# Altium footprint library ref-packages.PCBLIB: 1544 footprints (part 27 of 103)
Each footprint in its own frame and in the unit in brackets; x right, y up, seen from the top. Pads: shape width x height; smd on the part's side, far side on the other; paste and mask are expansions set on the pad; w line width, h text height; cw(c..) or ccw(c..) is an arc to the next point about the centre after c.
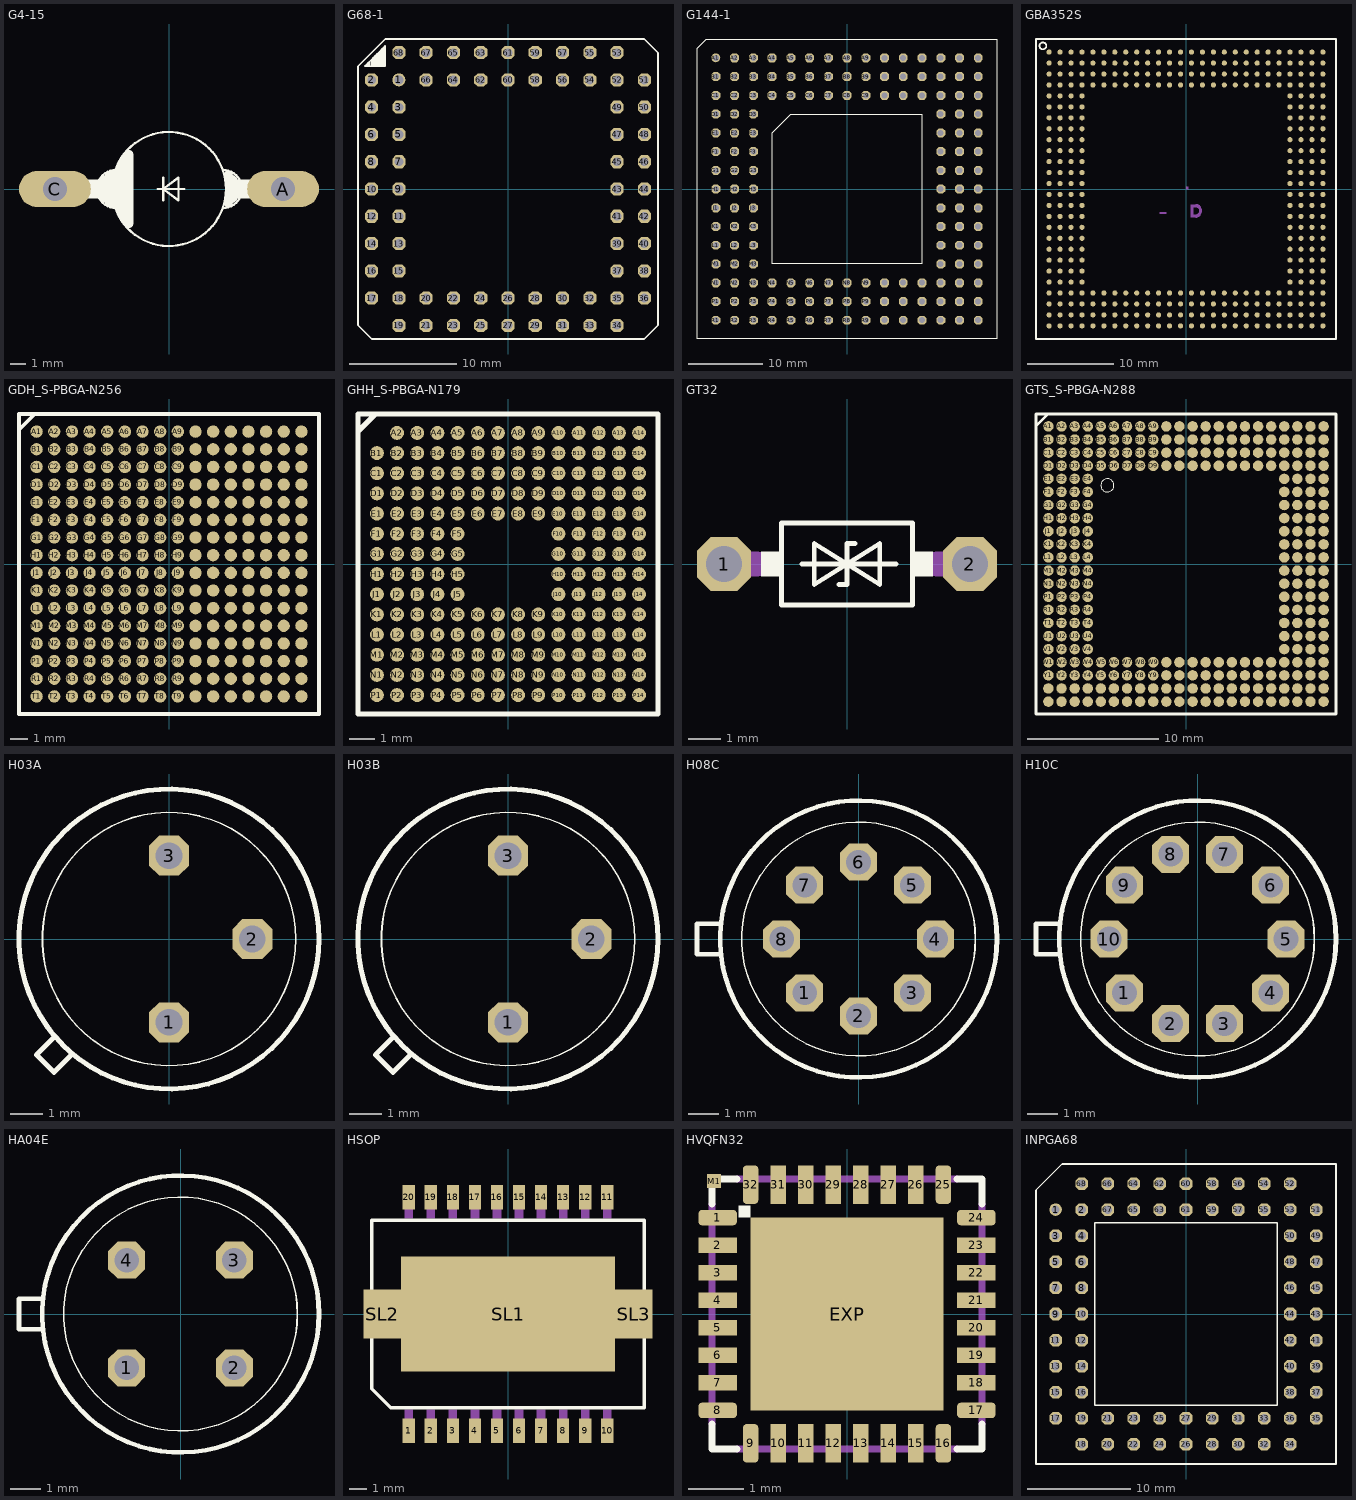
[diagram p26: the footprints below, top view; thin cyan lines are the x and y axes]

## G4-15 [mil]
pads (2):
  oval 189x94.5 hole 63: A(300,0) C(-300,0)
Top Overlay:
  circle w6: c0,0 r150
  rectangle: 150,-25 230,25
  rectangle: -230,-25 -150,25
  lines w6: -140,-50 cw(c-140,0) -140,50 ; -30,0 -15,0 ; -15,-30 -15,0 ; -15,30 -15,0 ; 40,0 -15,0 ; 141.97,-50 ccw(c141.97,0) 141.97,50 ; -15,0 25,-30 25,30 -15,0
  lines w24: -170,-20 -155,-35 ; -170,20 -155,35 ; -140,-40 -140,40 ; -115,-80 -125,-60 -125,60 -115,80 ; -105,-90 -105,90 ; 155,-35 170,-20 ; 155,35 170,20
Mechanical 16:
  lines w50: -300,0 -225,0 ; 225,0 300,0

## G68-1 [mil]
pads (68):
  round 48 hole 32: 1(-400,400)
  oct 48x48 hole 32: 2(-500,400) 3(-400,300) 4(-500,300) 5(-400,200) 6(-500,200) 7(-400,100) 8(-500,100) 9(-400,0) 10(-500,0) 11(-400,-100) 12(-500,-100) 13(-400,-200) 14(-500,-200) 15(-400,-300) 16(-500,-300) 17(-500,-400) 18(-400,-400) 19(-400,-500) 20(-300,-400) 21(-300,-500) 22(-200,-400) 23(-200,-500) 24(-100,-400) 25(-100,-500) 26(0,-400) 27(0,-500) 28(100,-400) 29(100,-500) 30(200,-400) 31(200,-500) 32(300,-400) 33(300,-500) 34(400,-500) 35(400,-400) 36(500,-400) 37(400,-300) 38(500,-300) 39(400,-200) 40(500,-200) 41(400,-100) 42(500,-100) 43(400,0) 44(500,0) 45(400,100) 46(500,100) 47(400,200) 48(500,200) 49(400,300) 50(500,300) 51(500,400) 52(400,400) 53(400,500) 54(300,400) 55(300,500) 56(200,400) 57(200,500) 58(100,400) 59(100,500) 60(0,400) 61(0,500) 62(-100,400) 63(-100,500) 64(-200,400) 65(-200,500) 66(-300,400) 67(-300,500) 68(-400,500)
Top Overlay:
  lines w6: -518.74,450 -512.5,450 ; -518.74,450 -525,450 -518.74,456.26 ; -518.74,450 -518.74,456.26 ; -518.74,456.26 -512.5,462.5 ; -512.5,450 -506.26,450 ; -512.5,450 -512.5,462.5 ; -512.5,462.5 -506.26,468.74 ; -506.26,450 -500,450 ; -506.26,450 -506.26,468.74 ; -506.26,468.74 -500,475 ; -500,450 -493.74,450 ; -500,450 -500,475 ; -500,475 -493.74,481.26 ; -493.74,450 -487.5,450 ; -493.74,450 -493.74,481.26 ; -493.74,481.26 -487.5,487.5 ; -487.5,450 -481.26,450 ; -487.5,450 -487.5,487.5 ; -487.5,487.5 -481.26,493.74 ; -481.26,450 -475,450 ; -481.26,450 -481.26,493.74 ; -481.26,493.74 -475,500 ; -475,450 -468.74,450 ; -475,450 -475,500 ; -475,500 -468.74,506.26 ; -468.74,450 -462.5,450 ; -468.74,450 -468.74,506.26 ; -468.74,506.26 -462.5,512.5 ; -462.5,450 -456.26,450 ; -462.5,450 -462.5,512.5 ; -462.5,512.5 -456.26,518.74 ; -456.26,450 -450,450 -450,525 -456.26,518.74 ; -456.26,450 -456.26,518.74 ; -550,-500 -500,-550 500,-550 550,-500 550,500 500,550 -450,550 -550,450 -550,-500

## G144-1 [mil]
pads (144):
  round 48 hole 32: A1(-700,700)
  oct 48x48 hole 32: A2(-600,700) A3(-500,700) A4(-400,700) A5(-300,700) A6(-200,700) A7(-100,700) A8(0,700) A9(100,700) A10(200,700) A11(300,700) A12(400,700) A13(500,700) A14(600,700) A15(700,700) B1(-700,600) B2(-600,600) B3(-500,600) B4(-400,600) B5(-300,600) B6(-200,600) B7(-100,600) B8(0,600) B9(100,600) B10(200,600) B11(300,600) B12(400,600) B13(500,600) B14(600,600) B15(700,600) C1(-700,500) C2(-600,500) C3(-500,500) C4(-400,500) C5(-300,500) C6(-200,500) C7(-100,500) C8(0,500) C9(100,500) C10(200,500) C11(300,500) C12(400,500) C13(500,500) C14(600,500) C15(700,500) D1(-700,400) D2(-600,400) D3(-500,400) D13(500,400) D14(600,400) D15(700,400) E1(-700,300) E2(-600,300) E3(-500,300) E13(500,300) E14(600,300) E15(700,300) F1(-700,200) F2(-600,200) F3(-500,200) F13(500,200) F14(600,200) F15(700,200) G1(-700,100) G2(-600,100) G3(-500,100) G13(500,100) G14(600,100) G15(700,100) H1(-700,0) H2(-600,0) H3(-500,0) H13(500,0) H14(600,0) H15(700,0) J1(-700,-100) J2(-600,-100) J3(-500,-100) J13(500,-100) J14(600,-100) J15(700,-100) K1(-700,-200) K2(-600,-200) K3(-500,-200) K13(500,-200) K14(600,-200) K15(700,-200) L1(-700,-300) L2(-600,-300) L3(-500,-300) L13(500,-300) L14(600,-300) L15(700,-300) M1(-700,-400) M2(-600,-400) M3(-500,-400) M13(500,-400) M14(600,-400) M15(700,-400) N1(-700,-500) N2(-600,-500) N3(-500,-500) N4(-400,-500) N5(-300,-500) N6(-200,-500) N7(-100,-500) N8(0,-500) N9(100,-500) N10(200,-500) N11(300,-500) N12(400,-500) N13(500,-500) N14(600,-500) N15(700,-500) P1(-700,-600) P2(-600,-600) P3(-500,-600) P4(-400,-600) P5(-300,-600) P6(-200,-600) P7(-100,-600) P8(0,-600) P9(100,-600) P10(200,-600) P11(300,-600) P12(400,-600) P13(500,-600) P14(600,-600) P15(700,-600) R1(-700,-700) R2(-600,-700) R3(-500,-700) R4(-400,-700) R5(-300,-700) R6(-200,-700) R7(-100,-700) R8(0,-700) R9(100,-700) R10(200,-700) R11(300,-700) R12(400,-700) R13(500,-700) R14(600,-700) R15(700,-700)
Top Overlay:
  lines w6: -800,-800 800,-800 800,800 -750,800 -800,750 -800,-800 ; -400,-400 400,-400 400,400 -300,400 -400,300 -400,-400

## GBA352S [mil]
pads (352):
  rrect100% 23.62x23.62 smd: A1(-625,625) A2(-575,625) A3(-525,625) A4(-475,625) A5(-425,625) A6(-375,625) A7(-325,625) A8(-275,625) A9(-225,625) A10(-175,625) A11(-125,625) A12(-75,625) A13(-25,625) A14(25,625) A15(75,625) A16(125,625) A17(175,625) A18(225,625) A19(275,625) A20(325,625) A21(375,625) A22(425,625) A23(475,625) A24(525,625) A25(575,625) A26(625,625) AA1(-625,-375) AA2(-575,-375) AA3(-525,-375) AA4(-475,-375) AA23(475,-375) AA24(525,-375) AA25(575,-375) AA26(625,-375) AB1(-625,-425) AB2(-575,-425) AB3(-525,-425) AB4(-475,-425) AB23(475,-425) AB24(525,-425) AB25(575,-425) AB26(625,-425) AC1(-625,-475) AC2(-575,-475) AC3(-525,-475) AC4(-475,-475) AC5(-425,-475) AC6(-375,-475) AC7(-325,-475) AC8(-275,-475) AC9(-225,-475) AC10(-175,-475) AC11(-125,-475) AC12(-75,-475) AC13(-25,-475) AC14(25,-475) AC15(75,-475) AC16(125,-475) AC17(175,-475) AC18(225,-475) AC19(275,-475) AC20(325,-475) AC21(375,-475) AC22(425,-475) AC23(475,-475) AC24(525,-475) AC25(575,-475) AC26(625,-475) AD1(-625,-525) AD2(-575,-525) AD3(-525,-525) AD4(-475,-525) AD5(-425,-525) AD6(-375,-525) AD7(-325,-525) AD8(-275,-525) AD9(-225,-525) AD10(-175,-525) AD11(-125,-525) AD12(-75,-525) AD13(-25,-525) AD14(25,-525) AD15(75,-525) AD16(125,-525) AD17(175,-525) AD18(225,-525) AD19(275,-525) AD20(325,-525) AD21(375,-525) AD22(425,-525) AD23(475,-525) AD24(525,-525) AD25(575,-525) AD26(625,-525) AE1(-625,-575) AE2(-575,-575) AE3(-525,-575) AE4(-475,-575) AE5(-425,-575) AE6(-375,-575) AE7(-325,-575) AE8(-275,-575) AE9(-225,-575) AE10(-175,-575) AE11(-125,-575) AE12(-75,-575) AE13(-25,-575) AE14(25,-575) AE15(75,-575) AE16(125,-575) AE17(175,-575) AE18(225,-575) AE19(275,-575) AE20(325,-575) AE21(375,-575) AE22(425,-575) AE23(475,-575) AE24(525,-575) AE25(575,-575) AE26(625,-575) AF1(-625,-625) AF2(-575,-625) AF3(-525,-625) AF4(-475,-625) AF5(-425,-625) AF6(-375,-625) AF7(-325,-625) AF8(-275,-625) AF9(-225,-625) AF10(-175,-625) AF11(-125,-625) AF12(-75,-625) AF13(-25,-625) AF14(25,-625) AF15(75,-625) AF16(125,-625) AF17(175,-625) AF18(225,-625) AF19(275,-625) AF20(325,-625) AF21(375,-625) AF22(425,-625) AF23(475,-625) AF24(525,-625) AF25(575,-625) AF26(625,-625) B1(-625,575) B2(-575,575) B3(-525,575) B4(-475,575) B5(-425,575) B6(-375,575) B7(-325,575) B8(-275,575) B9(-225,575) B10(-175,575) B11(-125,575) B12(-75,575) B13(-25,575) B14(25,575) B15(75,575) B16(125,575) B17(175,575) B18(225,575) B19(275,575) B20(325,575) B21(375,575) B22(425,575) B23(475,575) B24(525,575) B25(575,575) B26(625,575) C1(-625,525) C2(-575,525) C3(-525,525) C4(-475,525) C5(-425,525) C6(-375,525) C7(-325,525) C8(-275,525) C9(-225,525) C10(-175,525) C11(-125,525) C12(-75,525) C13(-25,525) C14(25,525) C15(75,525) C16(125,525) C17(175,525) C18(225,525) C19(275,525) C20(325,525) C21(375,525) C22(425,525) C23(475,525) C24(525,525) C25(575,525) C26(625,525) D1(-625,475) D2(-575,475) D3(-525,475) D4(-475,475) D5(-425,475) D6(-375,475) D7(-325,475) D8(-275,475) D9(-225,475) D10(-175,475) D11(-125,475) D12(-75,475) D13(-25,475) D14(25,475) D15(75,475) D16(125,475) D17(175,475) D18(225,475) D19(275,475) D20(325,475) D21(375,475) D22(425,475) D23(475,475) D24(525,475) D25(575,475) D26(625,475) E1(-625,425) E2(-575,425) E3(-525,425) E4(-475,425) E23(475,425) E24(525,425) E25(575,425) E26(625,425) F1(-625,375) F2(-575,375) F3(-525,375) F4(-475,375) F23(475,375) F24(525,375) F25(575,375) F26(625,375) G1(-625,325) G2(-575,325) G3(-525,325) G4(-475,325) G23(475,325) G24(525,325) G25(575,325) G26(625,325) H1(-625,275) H2(-575,275) H3(-525,275) H4(-475,275) H23(475,275) H24(525,275) H25(575,275) H26(625,275) J1(-625,225) J2(-575,225) J3(-525,225) J4(-475,225) J23(475,225) J24(525,225) J25(575,225) J26(625,225) K1(-625,175) K2(-575,175) K3(-525,175) K4(-475,175) K23(475,175) K24(525,175) K25(575,175) K26(625,175) L1(-625,125) L2(-575,125) L3(-525,125) L4(-475,125) L23(475,125) L24(525,125) L25(575,125) L26(625,125) M1(-625,75) M2(-575,75) M3(-525,75) M4(-475,75) M23(475,75) M24(525,75) M25(575,75) M26(625,75) N1(-625,25) N2(-575,25) N3(-525,25) N4(-475,25) N23(475,25) N24(525,25) N25(575,25) N26(625,25) P1(-625,-25) P2(-575,-25) P3(-525,-25) P4(-475,-25) P23(475,-25) P24(525,-25) P25(575,-25) P26(625,-25) R1(-625,-75) R2(-575,-75) R3(-525,-75) R4(-475,-75) R23(475,-75) R24(525,-75) R25(575,-75) R26(625,-75) T1(-625,-125) T2(-575,-125) T3(-525,-125) T4(-475,-125) T23(475,-125) T24(525,-125) T25(575,-125) T26(625,-125) U1(-625,-175) U2(-575,-175) U3(-525,-175) U4(-475,-175) U23(475,-175) U24(525,-175) U25(575,-175) U26(625,-175) V1(-625,-225) V2(-575,-225) V3(-525,-225) V4(-475,-225) V23(475,-225) V24(525,-225) V25(575,-225) V26(625,-225) W1(-625,-275) W2(-575,-275) W3(-525,-275) W4(-475,-275) W23(475,-275) W24(525,-275) W25(575,-275) W26(625,-275) Y1(-625,-325) Y2(-575,-325) Y3(-525,-325) Y4(-475,-325) Y23(475,-325) Y24(525,-325) Y25(575,-325) Y26(625,-325)
Top Overlay:
  circle w8: c-653.54,653.54 r15.74
  lines w8: -685.04,-685.04 -685.04,685.04 685.04,685.04 685.04,-685.04 -685.04,-685.04
Mechanical 16:
  rectangle: 23,-84 45,-70
  rectangle: 23,-130 45,-116
  rectangle: -120,-115 -90,-105
  rectangle: 20,-130 35,-70
  region: 0,0 10,0 10,10 0,10
  region: 0,0 10,0 10,10 0,10
  region: 0,0 10,0 10,10 0,10
  region: 0,0 10,0 10,10 0,10
  region: 0,0 10,0 10,10 0,10
  region: 0,0 10,0 10,10 0,10
  lines w2: 44,-129 ccw(c44,-100) 44,-71
  lines w8: 44,-125 ccw(c44,-100) 44,-75
  lines w10: 44,-121 ccw(c44,-100) 44,-79
  text "BGA352" at -85.63,-253.74 h49.6

## GDH_S-PBGA-N256 [mil]
pads (256):
  rrect100% 27.56x27.56 smd: A1(-295.28,295.28) A2(-255.91,295.28) A3(-216.54,295.28) A4(-177.17,295.28) A5(-137.8,295.28) A6(-98.43,295.28) A7(-59.06,295.28) A8(-19.69,295.28) A9(19.69,295.28) A10(59.06,295.28) A11(98.43,295.28) A12(137.8,295.28) A13(177.17,295.28) A14(216.54,295.28) A15(255.91,295.28) A16(295.28,295.28) B1(-295.28,255.91) B2(-255.91,255.91) B3(-216.54,255.91) B4(-177.17,255.91) B5(-137.8,255.91) B6(-98.43,255.91) B7(-59.06,255.91) B8(-19.69,255.91) B9(19.69,255.91) B10(59.06,255.91) B11(98.43,255.91) B12(137.8,255.91) B13(177.17,255.91) B14(216.54,255.91) B15(255.91,255.91) B16(295.28,255.91) C1(-295.28,216.54) C2(-255.91,216.54) C3(-216.54,216.54) C4(-177.17,216.54) C5(-137.8,216.54) C6(-98.43,216.54) C7(-59.06,216.54) C8(-19.69,216.54) C9(19.69,216.54) C10(59.06,216.54) C11(98.43,216.54) C12(137.8,216.54) C13(177.17,216.54) C14(216.54,216.54) C15(255.91,216.54) C16(295.28,216.54) D1(-295.28,177.17) D2(-255.91,177.17) D3(-216.54,177.17) D4(-177.17,177.17) D5(-137.8,177.17) D6(-98.43,177.17) D7(-59.06,177.17) D8(-19.69,177.17) D9(19.69,177.17) D10(59.06,177.17) D11(98.43,177.17) D12(137.8,177.17) D13(177.17,177.17) D14(216.54,177.17) D15(255.91,177.17) D16(295.28,177.17) E1(-295.28,137.8) E2(-255.91,137.8) E3(-216.54,137.8) E4(-177.17,137.8) E5(-137.8,137.8) E6(-98.43,137.8) E7(-59.06,137.8) E8(-19.69,137.8) E9(19.69,137.8) E10(59.06,137.8) E11(98.43,137.8) E12(137.8,137.8) E13(177.17,137.8) E14(216.54,137.8) E15(255.91,137.8) E16(295.28,137.8) F1(-295.28,98.43) F2(-255.91,98.43) F3(-216.54,98.43) F4(-177.17,98.43) F5(-137.8,98.43) F6(-98.43,98.43) F7(-59.06,98.43) F8(-19.69,98.43) F9(19.69,98.43) F10(59.06,98.43) F11(98.43,98.43) F12(137.8,98.43) F13(177.17,98.43) F14(216.54,98.43) F15(255.91,98.43) F16(295.28,98.43) G1(-295.28,59.06) G2(-255.91,59.06) G3(-216.54,59.06) G4(-177.17,59.06) G5(-137.8,59.06) G6(-98.43,59.06) G7(-59.06,59.06) G8(-19.69,59.06) G9(19.69,59.06) G10(59.06,59.06) G11(98.43,59.06) G12(137.8,59.06) G13(177.17,59.06) G14(216.54,59.06) G15(255.91,59.06) G16(295.28,59.06) H1(-295.28,19.69) H2(-255.91,19.69) H3(-216.54,19.69) H4(-177.17,19.69) H5(-137.8,19.69) H6(-98.43,19.69) H7(-59.06,19.69) H8(-19.69,19.69) H9(19.69,19.69) H10(59.06,19.69) H11(98.43,19.69) H12(137.8,19.69) H13(177.17,19.69) H14(216.54,19.69) H15(255.91,19.69) H16(295.28,19.69) J1(-295.28,-19.69) J2(-255.91,-19.69) J3(-216.54,-19.69) J4(-177.17,-19.69) J5(-137.8,-19.69) J6(-98.43,-19.69) J7(-59.06,-19.69) J8(-19.69,-19.69) J9(19.69,-19.69) J10(59.06,-19.69) J11(98.43,-19.69) J12(137.8,-19.69) J13(177.17,-19.69) J14(216.54,-19.69) J15(255.91,-19.69) J16(295.28,-19.69) K1(-295.28,-59.06) K2(-255.91,-59.06) K3(-216.54,-59.06) K4(-177.17,-59.06) K5(-137.8,-59.06) K6(-98.43,-59.06) K7(-59.06,-59.06) K8(-19.69,-59.06) K9(19.69,-59.06) K10(59.06,-59.06) K11(98.43,-59.06) K12(137.8,-59.06) K13(177.17,-59.06) K14(216.54,-59.06) K15(255.91,-59.06) K16(295.28,-59.06) L1(-295.28,-98.43) L2(-255.91,-98.43) L3(-216.54,-98.43) L4(-177.17,-98.43) L5(-137.8,-98.43) L6(-98.43,-98.43) L7(-59.06,-98.43) L8(-19.69,-98.43) L9(19.69,-98.43) L10(59.06,-98.43) L11(98.43,-98.43) L12(137.8,-98.43) L13(177.17,-98.43) L14(216.54,-98.43) L15(255.91,-98.43) L16(295.28,-98.43) M1(-295.28,-137.8) M2(-255.91,-137.8) M3(-216.54,-137.8) M4(-177.17,-137.8) M5(-137.8,-137.8) M6(-98.43,-137.8) M7(-59.06,-137.8) M8(-19.69,-137.8) M9(19.69,-137.8) M10(59.06,-137.8) M11(98.43,-137.8) M12(137.8,-137.8) M13(177.17,-137.8) M14(216.54,-137.8) M15(255.91,-137.8) M16(295.28,-137.8) N1(-295.28,-177.17) N2(-255.91,-177.17) N3(-216.54,-177.17) N4(-177.17,-177.17) N5(-137.8,-177.17) N6(-98.43,-177.17) N7(-59.06,-177.17) N8(-19.69,-177.17) N9(19.69,-177.17) N10(59.06,-177.17) N11(98.43,-177.17) N12(137.8,-177.17) N13(177.17,-177.17) N14(216.54,-177.17) N15(255.91,-177.17) N16(295.28,-177.17) P1(-295.28,-216.54) P2(-255.91,-216.54) P3(-216.54,-216.54) P4(-177.17,-216.54) P5(-137.8,-216.54) P6(-98.43,-216.54) P7(-59.06,-216.54) P8(-19.69,-216.54) P9(19.69,-216.54) P10(59.06,-216.54) P11(98.43,-216.54) P12(137.8,-216.54) P13(177.17,-216.54) P14(216.54,-216.54) P15(255.91,-216.54) P16(295.28,-216.54) R1(-295.28,-255.91) R2(-255.91,-255.91) R3(-216.54,-255.91) R4(-177.17,-255.91) R5(-137.8,-255.91) R6(-98.43,-255.91) R7(-59.06,-255.91) R8(-19.69,-255.91) R9(19.69,-255.91) R10(59.06,-255.91) R11(98.43,-255.91) R12(137.8,-255.91) R13(177.17,-255.91) R14(216.54,-255.91) R15(255.91,-255.91) R16(295.28,-255.91) T1(-295.28,-295.28) T2(-255.91,-295.28) T3(-216.54,-295.28) T4(-177.17,-295.28) T5(-137.8,-295.28) T6(-98.43,-295.28) T7(-59.06,-295.28) T8(-19.69,-295.28) T9(19.69,-295.28) T10(59.06,-295.28) T11(98.43,-295.28) T12(137.8,-295.28) T13(177.17,-295.28) T14(216.54,-295.28) T15(255.91,-295.28) T16(295.28,-295.28)
Top Overlay:
  lines w8: -334.58,299.21 -334.58,334.58 -299.21,334.58 ; -334.58,299.21 -334.58,-334.58 334.58,-334.58 334.58,334.58 -299.21,334.58 ; -334.58,299.21 -299.21,334.58
Top Solder:
  drawing of 256 lines, arcs and shapes, not listed

## GHH_S-PBGA-N179 [mm]
pads (179):
  rrect100% 0.55x0.55 smd: A2(-4.4,5.2) A3(-3.6,5.2) A4(-2.8,5.2) A5(-2,5.2) A6(-1.2,5.2) A7(-0.4,5.2) A8(0.4,5.2) A9(1.2,5.2) A10(2,5.2) A11(2.8,5.2) A12(3.6,5.2) A13(4.4,5.2) A14(5.2,5.2) B1(-5.2,4.4) B2(-4.4,4.4) B3(-3.6,4.4) B4(-2.8,4.4) B5(-2,4.4) B6(-1.2,4.4) B7(-0.4,4.4) B8(0.4,4.4) B9(1.2,4.4) B10(2,4.4) B11(2.8,4.4) B12(3.6,4.4) B13(4.4,4.4) B14(5.2,4.4) C1(-5.2,3.6) C2(-4.4,3.6) C3(-3.6,3.6) C4(-2.8,3.6) C5(-2,3.6) C6(-1.2,3.6) C7(-0.4,3.6) C8(0.4,3.6) C9(1.2,3.6) C10(2,3.6) C11(2.8,3.6) C12(3.6,3.6) C13(4.4,3.6) C14(5.2,3.6) D1(-5.2,2.8) D2(-4.4,2.8) D3(-3.6,2.8) D4(-2.8,2.8) D5(-2,2.8) D6(-1.2,2.8) D7(-0.4,2.8) D8(0.4,2.8) D9(1.2,2.8) D10(2,2.8) D11(2.8,2.8) D12(3.6,2.8) D13(4.4,2.8) D14(5.2,2.8) E1(-5.2,2) E2(-4.4,2) E3(-3.6,2) E4(-2.8,2) E5(-2,2) E6(-1.2,2) E7(-0.4,2) E8(0.4,2) E9(1.2,2) E10(2,2) E11(2.8,2) E12(3.6,2) E13(4.4,2) E14(5.2,2) F1(-5.2,1.2) F2(-4.4,1.2) F3(-3.6,1.2) F4(-2.8,1.2) F5(-2,1.2) F10(2,1.2) F11(2.8,1.2) F12(3.6,1.2) F13(4.4,1.2) F14(5.2,1.2) G1(-5.2,0.4) G2(-4.4,0.4) G3(-3.6,0.4) G4(-2.8,0.4) G5(-2,0.4) G10(2,0.4) G11(2.8,0.4) G12(3.6,0.4) G13(4.4,0.4) G14(5.2,0.4) H1(-5.2,-0.4) H2(-4.4,-0.4) H3(-3.6,-0.4) H4(-2.8,-0.4) H5(-2,-0.4) H10(2,-0.4) H11(2.8,-0.4) H12(3.6,-0.4) H13(4.4,-0.4) H14(5.2,-0.4) J1(-5.2,-1.2) J2(-4.4,-1.2) J3(-3.6,-1.2) J4(-2.8,-1.2) J5(-2,-1.2) J10(2,-1.2) J11(2.8,-1.2) J12(3.6,-1.2) J13(4.4,-1.2) J14(5.2,-1.2) K1(-5.2,-2) K2(-4.4,-2) K3(-3.6,-2) K4(-2.8,-2) K5(-2,-2) K6(-1.2,-2) K7(-0.4,-2) K8(0.4,-2) K9(1.2,-2) K10(2,-2) K11(2.8,-2) K12(3.6,-2) K13(4.4,-2) K14(5.2,-2) L1(-5.2,-2.8) L2(-4.4,-2.8) L3(-3.6,-2.8) L4(-2.8,-2.8) L5(-2,-2.8) L6(-1.2,-2.8) L7(-0.4,-2.8) L8(0.4,-2.8) L9(1.2,-2.8) L10(2,-2.8) L11(2.8,-2.8) L12(3.6,-2.8) L13(4.4,-2.8) L14(5.2,-2.8) M1(-5.2,-3.6) M2(-4.4,-3.6) M3(-3.6,-3.6) M4(-2.8,-3.6) M5(-2,-3.6) M6(-1.2,-3.6) M7(-0.4,-3.6) M8(0.4,-3.6) M9(1.2,-3.6) M10(2,-3.6) M11(2.8,-3.6) M12(3.6,-3.6) M13(4.4,-3.6) M14(5.2,-3.6) N1(-5.2,-4.4) N2(-4.4,-4.4) N3(-3.6,-4.4) N4(-2.8,-4.4) N5(-2,-4.4) N6(-1.2,-4.4) N7(-0.4,-4.4) N8(0.4,-4.4) N9(1.2,-4.4) N10(2,-4.4) N11(2.8,-4.4) N12(3.6,-4.4) N13(4.4,-4.4) N14(5.2,-4.4) P1(-5.2,-5.2) P2(-4.4,-5.2) P3(-3.6,-5.2) P4(-2.8,-5.2) P5(-2,-5.2) P6(-1.2,-5.2) P7(-0.4,-5.2) P8(0.4,-5.2) P9(1.2,-5.2) P10(2,-5.2) P11(2.8,-5.2) P12(3.6,-5.2) P13(4.4,-5.2) P14(5.2,-5.2)
Top Overlay:
  lines w0.203: -5.948,5.25 -5.948,5.948 -5.25,5.948 ; -5.948,5.25 -5.948,-5.948 5.948,-5.948 5.948,5.948 -5.25,5.948 ; -5.948,5.25 -5.25,5.948
Top Solder:
  drawing of 179 lines, arcs and shapes, not listed

## GT32 [mil]
pads (2):
  oct 66x66 hole 44: 1(-150,0) 2(150,0)
Top Overlay:
  rectangle: 80,-15 105,15
  rectangle: -105,-15 -80,15
  lines w6: -55,0 0,0 ; -10,-25 0,-25 0,0 ; 10,25 0,25 0,0 ; 60,0 0,0 ; 0,0 40,-25 40,25 0,0 ; 0,0 -40,25 -40,-25 0,0 ; -80,-50 80,-50 80,50 -80,50 -80,-50
Mechanical 16:
  lines w30: -150,0 -110,0 ; 110,0 150,0

## GTS_S-PBGA-N288 [mil]
pads (288):
  rrect100% 31.5x31.5 smd: A1(-413.39,413.39) A2(-374.02,413.39) A3(-334.65,413.39) A4(-295.28,413.39) A5(-255.91,413.39) A6(-216.54,413.39) A7(-177.17,413.39) A8(-137.8,413.39) A9(-98.43,413.39) A10(-59.06,413.39) A11(-19.69,413.39) A12(19.69,413.39) A13(59.06,413.39) A14(98.43,413.39) A15(137.8,413.39) A16(177.17,413.39) A17(216.54,413.39) A18(255.91,413.39) A19(295.28,413.39) A20(334.65,413.39) A21(374.02,413.39) A22(413.39,413.39) AA1(-413.39,-374.02) AA2(-374.02,-374.02) AA3(-334.65,-374.02) AA4(-295.28,-374.02) AA5(-255.91,-374.02) AA6(-216.54,-374.02) AA7(-177.17,-374.02) AA8(-137.8,-374.02) AA9(-98.43,-374.02) AA10(-59.06,-374.02) AA11(-19.69,-374.02) AA12(19.69,-374.02) AA13(59.06,-374.02) AA14(98.43,-374.02) AA15(137.8,-374.02) AA16(177.17,-374.02) AA17(216.54,-374.02) AA18(255.91,-374.02) AA19(295.28,-374.02) AA20(334.65,-374.02) AA21(374.02,-374.02) AA22(413.39,-374.02) AB1(-413.39,-413.39) AB2(-374.02,-413.39) AB3(-334.65,-413.39) AB4(-295.28,-413.39) AB5(-255.91,-413.39) AB6(-216.54,-413.39) AB7(-177.17,-413.39) AB8(-137.8,-413.39) AB9(-98.43,-413.39) AB10(-59.06,-413.39) AB11(-19.69,-413.39) AB12(19.69,-413.39) AB13(59.06,-413.39) AB14(98.43,-413.39) AB15(137.8,-413.39) AB16(177.17,-413.39) AB17(216.54,-413.39) AB18(255.91,-413.39) AB19(295.28,-413.39) AB20(334.65,-413.39) AB21(374.02,-413.39) AB22(413.39,-413.39) B1(-413.39,374.02) B2(-374.02,374.02) B3(-334.65,374.02) B4(-295.28,374.02) B5(-255.91,374.02) B6(-216.54,374.02) B7(-177.17,374.02) B8(-137.8,374.02) B9(-98.43,374.02) B10(-59.06,374.02) B11(-19.69,374.02) B12(19.69,374.02) B13(59.06,374.02) B14(98.43,374.02) B15(137.8,374.02) B16(177.17,374.02) B17(216.54,374.02) B18(255.91,374.02) B19(295.28,374.02) B20(334.65,374.02) B21(374.02,374.02) B22(413.39,374.02) C1(-413.39,334.65) C2(-374.02,334.65) C3(-334.65,334.65) C4(-295.28,334.65) C5(-255.91,334.65) C6(-216.54,334.65) C7(-177.17,334.65) C8(-137.8,334.65) C9(-98.43,334.65) C10(-59.06,334.65) C11(-19.69,334.65) C12(19.69,334.65) C13(59.06,334.65) C14(98.43,334.65) C15(137.8,334.65) C16(177.17,334.65) C17(216.54,334.65) C18(255.91,334.65) C19(295.28,334.65) C20(334.65,334.65) C21(374.02,334.65) C22(413.39,334.65) D1(-413.39,295.28) D2(-374.02,295.28) D3(-334.65,295.28) D4(-295.28,295.28) D5(-255.91,295.28) D6(-216.54,295.28) D7(-177.17,295.28) D8(-137.8,295.28) D9(-98.43,295.28) D10(-59.06,295.28) D11(-19.69,295.28) D12(19.69,295.28) D13(59.06,295.28) D14(98.43,295.28) D15(137.8,295.28) D16(177.17,295.28) D17(216.54,295.28) D18(255.91,295.28) D19(295.28,295.28) D20(334.65,295.28) D21(374.02,295.28) D22(413.39,295.28) E1(-413.39,255.91) E2(-374.02,255.91) E3(-334.65,255.91) E4(-295.28,255.91) E19(295.28,255.91) E20(334.65,255.91) E21(374.02,255.91) E22(413.39,255.91) F1(-413.39,216.54) F2(-374.02,216.54) F3(-334.65,216.54) F4(-295.28,216.54) F19(295.28,216.54) F20(334.65,216.54) F21(374.02,216.54) F22(413.39,216.54) G1(-413.39,177.17) G2(-374.02,177.17) G3(-334.65,177.17) G4(-295.28,177.17) G19(295.28,177.17) G20(334.65,177.17) G21(374.02,177.17) G22(413.39,177.17) H1(-413.39,137.8) H2(-374.02,137.8) H3(-334.65,137.8) H4(-295.28,137.8) H19(295.28,137.8) H20(334.65,137.8) H21(374.02,137.8) H22(413.39,137.8) J1(-413.39,98.43) J2(-374.02,98.43) J3(-334.65,98.43) J4(-295.28,98.43) J19(295.28,98.43) J20(334.65,98.43) J21(374.02,98.43) J22(413.39,98.43) K1(-413.39,59.06) K2(-374.02,59.06) K3(-334.65,59.06) K4(-295.28,59.06) K19(295.28,59.06) K20(334.65,59.06) K21(374.02,59.06) K22(413.39,59.06) L1(-413.39,19.69) L2(-374.02,19.69) L3(-334.65,19.69) L4(-295.28,19.69) L19(295.28,19.69) L20(334.65,19.69) L21(374.02,19.69) L22(413.39,19.69) M1(-413.39,-19.69) M2(-374.02,-19.69) M3(-334.65,-19.69) M4(-295.28,-19.69) M19(295.28,-19.69) M20(334.65,-19.69) M21(374.02,-19.69) M22(413.39,-19.69) N1(-413.39,-59.06) N2(-374.02,-59.06) N3(-334.65,-59.06) N4(-295.28,-59.06) N19(295.28,-59.06) N20(334.65,-59.06) N21(374.02,-59.06) N22(413.39,-59.06) P1(-413.39,-98.43) P2(-374.02,-98.43) P3(-334.65,-98.43) P4(-295.28,-98.43) P19(295.28,-98.43) P20(334.65,-98.43) P21(374.02,-98.43) P22(413.39,-98.43) R1(-413.39,-137.8) R2(-374.02,-137.8) R3(-334.65,-137.8) R4(-295.28,-137.8) R19(295.28,-137.8) R20(334.65,-137.8) R21(374.02,-137.8) R22(413.39,-137.8) T1(-413.39,-177.17) T2(-374.02,-177.17) T3(-334.65,-177.17) T4(-295.28,-177.17) T19(295.28,-177.17) T20(334.65,-177.17) T21(374.02,-177.17) T22(413.39,-177.17) U1(-413.39,-216.54) U2(-374.02,-216.54) U3(-334.65,-216.54) U4(-295.28,-216.54) U19(295.28,-216.54) U20(334.65,-216.54) U21(374.02,-216.54) U22(413.39,-216.54) V1(-413.39,-255.91) V2(-374.02,-255.91) V3(-334.65,-255.91) V4(-295.28,-255.91) V19(295.28,-255.91) V20(334.65,-255.91) V21(374.02,-255.91) V22(413.39,-255.91) W1(-413.39,-295.28) W2(-374.02,-295.28) W3(-334.65,-295.28) W4(-295.28,-295.28) W5(-255.91,-295.28) W6(-216.54,-295.28) W7(-177.17,-295.28) W8(-137.8,-295.28) W9(-98.43,-295.28) W10(-59.06,-295.28) W11(-19.69,-295.28) W12(19.69,-295.28) W13(59.06,-295.28) W14(98.43,-295.28) W15(137.8,-295.28) W16(177.17,-295.28) W17(216.54,-295.28) W18(255.91,-295.28) W19(295.28,-295.28) W20(334.65,-295.28) W21(374.02,-295.28) W22(413.39,-295.28) Y1(-413.39,-334.65) Y2(-374.02,-334.65) Y3(-334.65,-334.65) Y4(-295.28,-334.65) Y5(-255.91,-334.65) Y6(-216.54,-334.65) Y7(-177.17,-334.65) Y8(-137.8,-334.65) Y9(-98.43,-334.65) Y10(-59.06,-334.65) Y11(-19.69,-334.65) Y12(19.69,-334.65) Y13(59.06,-334.65) Y14(98.43,-334.65) Y15(137.8,-334.65) Y16(177.17,-334.65) Y17(216.54,-334.65) Y18(255.91,-334.65) Y19(295.28,-334.65) Y20(334.65,-334.65) Y21(374.02,-334.65) Y22(413.39,-334.65)
Top Overlay:
  circle w0: c-236.22,236.22 r19.69
  lines w8: -450.72,415.35 -450.72,450.72 -415.35,450.72 ; -450.72,415.35 -450.72,-450.72 450.72,-450.72 450.72,450.72 -415.35,450.72 ; -450.72,415.35 -415.35,450.72
Top Solder:
  drawing of 288 lines, arcs and shapes, not listed

## H03A [mil]
pads (3):
  oct 48x48 hole 32: 1(0,-100) 2(100,0) 3(0,100)
Top Overlay:
  circle w6: c0,0 r180
  circle w2: c0,0 r152
  lines w6: -138,-118 -159,-139 -138,-160 -117,-139

## H03B [mil]
pads (3):
  oct 48x48 hole 32: 1(0,-100) 2(100,0) 3(0,100)
Top Overlay:
  circle w6: c0,0 r180
  circle w2: c0,0 r152
  lines w6: -138,-118 -159,-139 -138,-160 -117,-139

## H08C [mil]
pads (8):
  oct 48x48 hole 32: 1(-70,-70) 2(0,-100) 3(70,-70) 4(100,0) 5(70,70) 6(0,100) 7(-70,70) 8(-100,0)
Top Overlay:
  circle w6: c0,0 r180
  circle w2: c0,0 r152
  lines w6: -180,-20 -210,-20 -210,20 -180,20

## H10C [mil]
pads (10):
  oct 48x48 hole 32: 1(-95,-70) 2(-35,-110) 3(35,-110) 4(95,-70) 5(115,0) 6(95,70) 7(35,110) 8(-35,110) 9(-95,70) 10(-115,0)
Top Overlay:
  circle w6: c0,0 r180
  circle w2: c0,0 r152
  lines w6: -180,-20 -210,-20 -210,20 -180,20

## HA04E [mil]
pads (4):
  oct 48x48 hole 32: 1(-70,-70) 2(70,-70) 3(70,70) 4(-70,70)
Top Overlay:
  circle w6: c0,0 r180
  circle w2: c0,0 r152
  lines w6: -180,-20 -210,-20 -210,20 -180,20

## HSOP [mil]
pads (23):
  rect 27.56x55.12 smd: 1(-225,-265) 2(-175,-265) 3(-125,-265) 4(-75,-265) 5(-25,-265) 6(25,-265) 7(75,-265) 8(125,-265) 9(175,-265) 10(225,-265) 11(225,265) 12(175,265) 13(125,265) 14(75,265) 15(25,265) 16(-25,265) 17(-75,265) 18(-125,265) 19(-175,265) 20(-225,265)
  rect 486.22x259.84 smd: SL1(0,0)
  rect 84.65x110.24 smd: SL2(-285,0) SL3(285,0)
Top Overlay:
  lines w8: -309.06,-169.29 -309.06,212.6 309.06,212.6 309.06,-212.6 -265.75,-212.6 -309.06,-169.29
Mechanical 16:
  rectangle: -234.84,-279.53 -215.16,-216.54
  rectangle: -184.84,-279.53 -165.16,-216.54
  rectangle: -134.84,-279.53 -115.16,-216.54
  rectangle: -84.84,-279.53 -65.16,-216.54
  rectangle: -34.84,-279.53 -15.16,-216.54
  rectangle: 15.16,-279.53 34.84,-216.54
  rectangle: 65.16,-279.53 84.84,-216.54
  rectangle: 115.16,-279.53 134.84,-216.54
  rectangle: 165.16,-279.53 184.84,-216.54
  rectangle: 215.16,-279.53 234.84,-216.54
  region: 234.84,279.53 215.16,279.53 215.16,216.54 234.84,216.54
  region: 184.84,279.53 165.16,279.53 165.16,216.54 184.84,216.54
  region: 134.84,279.53 115.16,279.53 115.16,216.54 134.84,216.54
  region: 84.84,279.53 65.16,279.53 65.16,216.54 84.84,216.54
  region: 34.84,279.53 15.16,279.53 15.16,216.54 34.84,216.54
  region: -15.16,279.53 -34.84,279.53 -34.84,216.54 -15.16,216.54
  region: -65.16,279.53 -84.84,279.53 -84.84,216.54 -65.16,216.54
  region: -115.16,279.53 -134.84,279.53 -134.84,216.54 -115.16,216.54
  region: -165.16,279.53 -184.84,279.53 -184.84,216.54 -165.16,216.54
  region: -215.16,279.53 -234.84,279.53 -234.84,216.54 -215.16,216.54

## HVQFN32 [mm]
pads (34):
  rrect50% 0.7x0.28 smd: 1(-2.35,1.75) 8(-2.35,-1.75) 17(2.35,-1.75) 24(2.35,1.75)
  rect 0.7x0.28 smd: 2(-2.35,1.25) 3(-2.35,0.75) 4(-2.35,0.25) 5(-2.35,-0.25) 6(-2.35,-0.75) 7(-2.35,-1.25) 18(2.35,-1.25) 19(2.35,-0.75) 20(2.35,-0.25) 21(2.35,0.25) 22(2.35,0.75) 23(2.35,1.25)
  rrect50% 0.28x0.7 smd: 9(-1.75,-2.35) 16(1.75,-2.35) 25(1.75,2.35) 32(-1.75,2.35)
  rect 0.28x0.7 smd: 10(-1.25,-2.35) 11(-0.75,-2.35) 12(-0.25,-2.35) 13(0.25,-2.35) 14(0.75,-2.35) 15(1.25,-2.35) 26(1.25,2.35) 27(0.75,2.35) 28(0.25,2.35) 29(-0.25,2.35) 30(-0.75,2.35) 31(-1.25,2.35)
  rect 3.5x3.5 smd: EXP(0,0)
  rect 0.25x0.25 smd: M1(-2.415,2.415)
Top Overlay:
  rectangle: -1.975,1.75 -1.75,1.975
  lines w0.127: -2.45,-2 -2.45,-2.45 -2,-2.45 ; -2.45,2 -2.45,2.45 -2,2.45 ; 2,-2.45 2.45,-2.45 2.45,-2 ; 2,2.45 2.45,2.45 2.45,2
Top Solder:
  rectangle: -1.75,-1.75 1.75,1.75
  rectangle: -2.725,1.575 -1.975,1.925
  rectangle: -2.725,1.075 -1.975,1.425
  rectangle: -2.725,0.575 -1.975,0.925
  rectangle: -2.725,0.075 -1.975,0.425
  rectangle: -2.725,-0.425 -1.975,-0.075
  rectangle: -2.725,-0.925 -1.975,-0.575
  rectangle: -2.725,-1.425 -1.975,-1.075
  rectangle: -2.725,-1.925 -1.975,-1.575
  region: -1.575,-2.725 -1.575,-1.975 -1.925,-1.975 -1.925,-2.725
  region: -1.075,-2.725 -1.075,-1.975 -1.425,-1.975 -1.425,-2.725
  region: -0.575,-2.725 -0.575,-1.975 -0.925,-1.975 -0.925,-2.725
  region: -0.075,-2.725 -0.075,-1.975 -0.425,-1.975 -0.425,-2.725
  region: 0.425,-2.725 0.425,-1.975 0.075,-1.975 0.075,-2.725
  region: 0.925,-2.725 0.925,-1.975 0.575,-1.975 0.575,-2.725
  region: 1.425,-2.725 1.425,-1.975 1.075,-1.975 1.075,-2.725
  region: 1.925,-2.725 1.925,-1.975 1.575,-1.975 1.575,-2.725
  region: 2.725,-1.575 1.975,-1.575 1.975,-1.925 2.725,-1.925
  region: 2.725,-1.075 1.975,-1.075 1.975,-1.425 2.725,-1.425
  region: 2.725,-0.575 1.975,-0.575 1.975,-0.925 2.725,-0.925
  region: 2.725,-0.075 1.975,-0.075 1.975,-0.425 2.725,-0.425
  region: 2.725,0.425 1.975,0.425 1.975,0.075 2.725,0.075
  region: 2.725,0.925 1.975,0.925 1.975,0.575 2.725,0.575
  region: 2.725,1.425 1.975,1.425 1.975,1.075 2.725,1.075
  region: 2.725,1.925 1.975,1.925 1.975,1.575 2.725,1.575
  region: 1.575,2.725 1.575,1.975 1.925,1.975 1.925,2.725
  region: 1.075,2.725 1.075,1.975 1.425,1.975 1.425,2.725
  region: 0.575,2.725 0.575,1.975 0.925,1.975 0.925,2.725
  region: 0.075,2.725 0.075,1.975 0.425,1.975 0.425,2.725
  region: -0.425,2.725 -0.425,1.975 -0.075,1.975 -0.075,2.725
  region: -0.925,2.725 -0.925,1.975 -0.575,1.975 -0.575,2.725
  region: -1.425,2.725 -1.425,1.975 -1.075,1.975 -1.075,2.725
  region: -1.925,2.725 -1.925,1.975 -1.575,1.975 -1.575,2.725
Mechanical 16:
  lines w0.127: -2.45,-2 -2.45,2 ; -2,-2.45 2,-2.45 ; -2,2.45 2,2.45 ; 2.45,-2 2.45,2

## INPGA68 [mil]
pads (68):
  round 48 hole 32: 1(-500,400)
  oct 48x48 hole 32: 2(-400,400) 3(-500,300) 4(-400,300) 5(-500,200) 6(-400,200) 7(-500,100) 8(-400,100) 9(-500,0) 10(-400,0) 11(-500,-100) 12(-400,-100) 13(-500,-200) 14(-400,-200) 15(-500,-300) 16(-400,-300) 17(-500,-400) 18(-400,-500) 19(-400,-400) 20(-300,-500) 21(-300,-400) 22(-200,-500) 23(-200,-400) 24(-100,-500) 25(-100,-400) 26(0,-500) 27(0,-400) 28(100,-500) 29(100,-400) 30(200,-500) 31(200,-400) 32(300,-500) 33(300,-400) 34(400,-500) 35(500,-400) 36(400,-400) 37(500,-300) 38(400,-300) 39(500,-200) 40(400,-200) 41(500,-100) 42(400,-100) 43(500,0) 44(400,0) 45(500,100) 46(400,100) 47(500,200) 48(400,200) 49(500,300) 50(400,300) 51(500,400) 52(400,500) 53(400,400) 54(300,500) 55(300,400) 56(200,500) 57(200,400) 58(100,500) 59(100,400) 60(0,500) 61(0,400) 62(-100,500) 63(-100,400) 64(-200,500) 65(-200,400) 66(-300,500) 67(-300,400) 68(-400,500)
Top Overlay:
  lines w6: -575,-575 575,-575 575,575 -475,575 -575,475 -575,-575 ; -350,-350 -350,350 350,350 350,-350 -350,-350